# Altium footprint library microbuilder.PCBLIB: 422 footprints (part 3 of 27)
Each footprint in its own frame and in the unit in brackets; x right, y up, seen from the top. Pads: shape width x height; smd on the part's side, far side on the other; paste and mask are expansions set on the pad; w line width, h text height; cw(c..) or ccw(c..) is an arc to the next point about the centre after c.
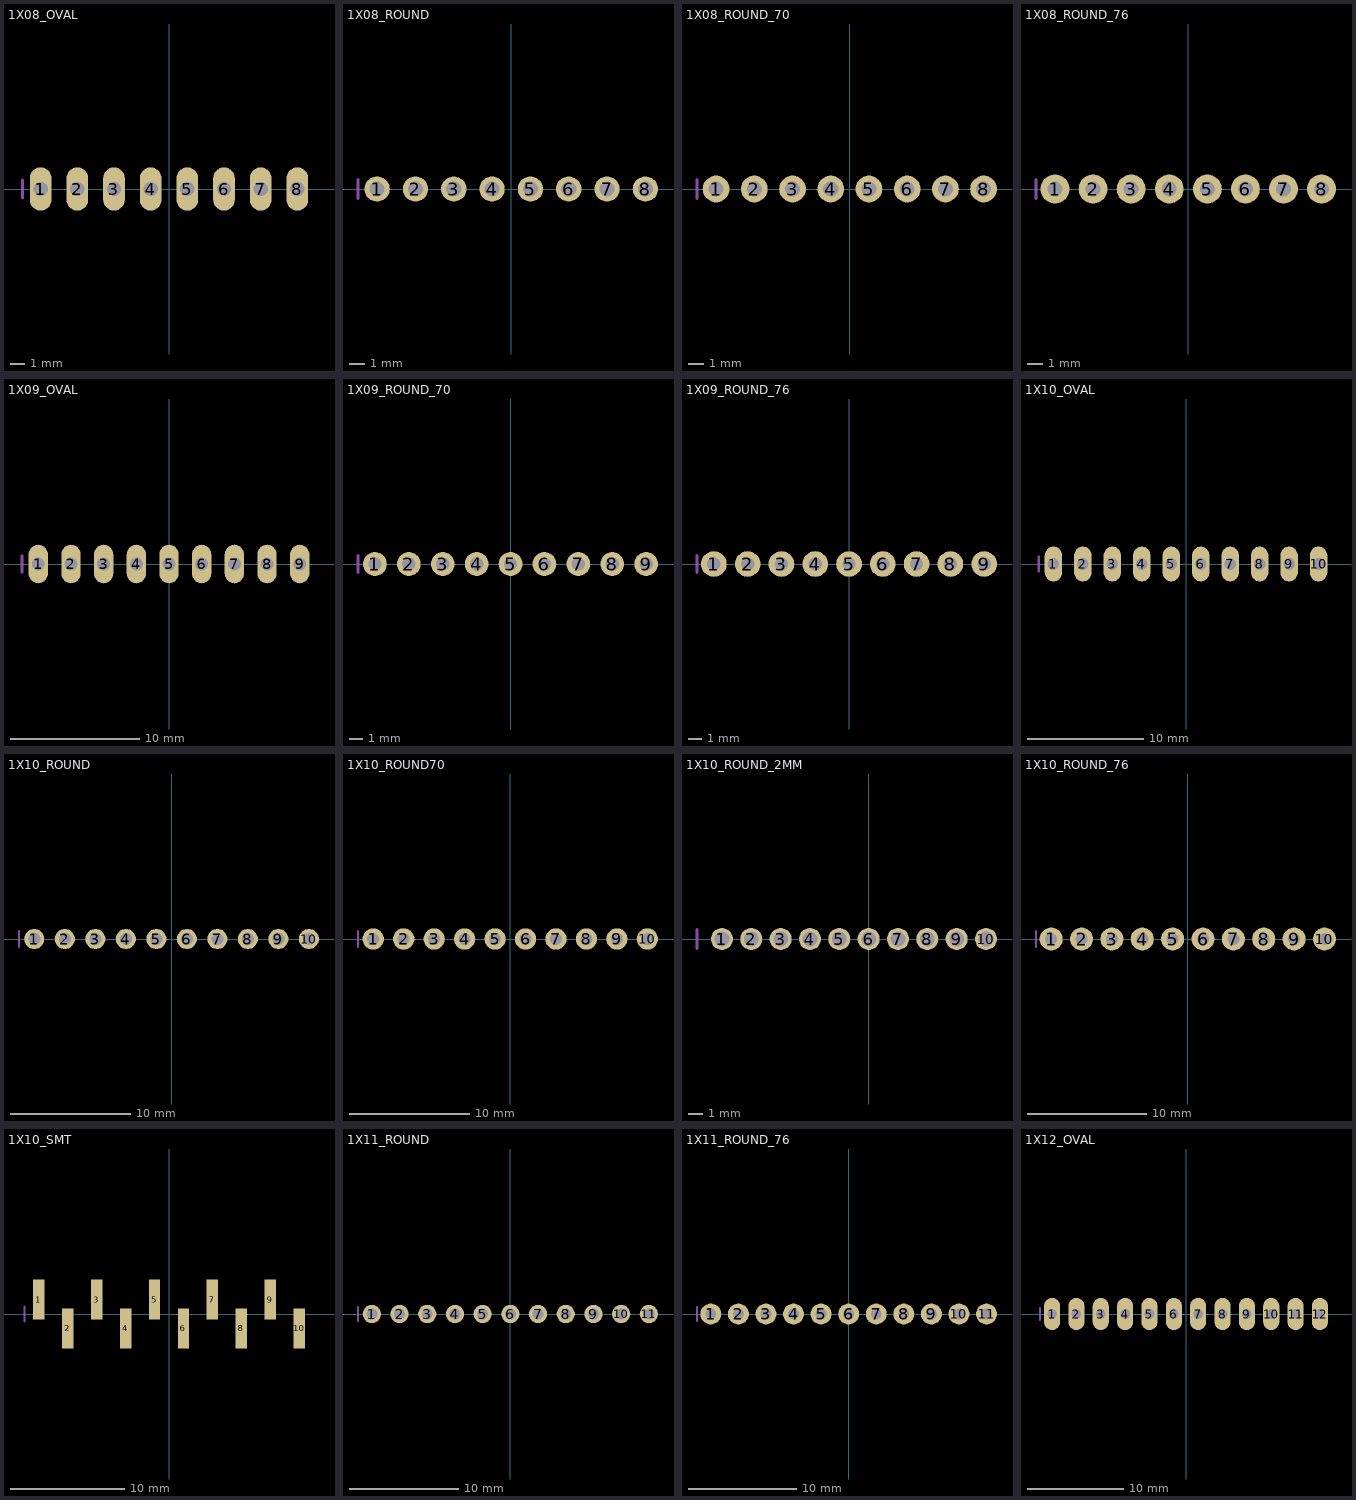
[diagram p2: the footprints below, top view; thin cyan lines are the x and y axes]

## 1X08_OVAL [mm]
pads (8):
  oval 1.5x3 hole 1: 1(-8.89,0) 2(-6.35,0) 3(-3.81,0) 4(-1.27,0) 5(1.27,0) 6(3.81,0) 7(6.35,0) 8(8.89,0)
Mechanical 16:
  rectangle: 6.096,-0.254 6.604,0.254
  rectangle: 3.556,-0.254 4.064,0.254
  rectangle: 1.016,-0.254 1.524,0.254
  rectangle: -1.524,-0.254 -1.016,0.254
  rectangle: -4.064,-0.254 -3.556,0.254
  rectangle: -6.604,-0.254 -6.096,0.254
  rectangle: -9.144,-0.254 -8.636,0.254
  rectangle: 8.636,-0.254 9.144,0.254
  lines w0.203: -10.16,-0.635 -10.16,0.635

## 1X08_ROUND [mil]
pads (8):
  round 66 hole 39.37: 1(-350,0) 2(-250,0) 3(-150,0) 4(-50,0) 5(50,0) 6(150,0) 7(250,0) 8(350,0)
Mechanical 16:
  rectangle: 240,-10 260,10
  rectangle: 140,-10 160,10
  rectangle: 40,-10 60,10
  rectangle: -60,-10 -40,10
  rectangle: -160,-10 -140,10
  rectangle: -260,-10 -240,10
  rectangle: -360,-10 -340,10
  rectangle: 340,-10 360,10
  lines w8: -400,-25 -400,25

## 1X08_ROUND_70 [mil]
pads (8):
  round 70 hole 39.37: 1(-350,0) 2(-250,0) 3(-150,0) 4(-50,0) 5(50,0) 6(150,0) 7(250,0) 8(350,0)
Mechanical 16:
  rectangle: 240,-10 260,10
  rectangle: 140,-10 160,10
  rectangle: 40,-10 60,10
  rectangle: -60,-10 -40,10
  rectangle: -160,-10 -140,10
  rectangle: -260,-10 -240,10
  rectangle: -360,-10 -340,10
  rectangle: 340,-10 360,10
  lines w8: -400,-25 -400,25

## 1X08_ROUND_76 [mil]
pads (8):
  round 76 hole 39.37: 1(-350,0) 2(-250,0) 3(-150,0) 4(-50,0) 5(50,0) 6(150,0) 7(250,0) 8(350,0)
Mechanical 16:
  rectangle: 240,-10 260,10
  rectangle: 140,-10 160,10
  rectangle: 40,-10 60,10
  rectangle: -60,-10 -40,10
  rectangle: -160,-10 -140,10
  rectangle: -260,-10 -240,10
  rectangle: -360,-10 -340,10
  rectangle: 340,-10 360,10
  lines w8: -400,-25 -400,25

## 1X09_OVAL [mm]
pads (9):
  oval 1.5x3 hole 1: 1(-10.16,0) 2(-7.62,0) 3(-5.08,0) 4(-2.54,0) 5(0,0) 6(2.54,0) 7(5.08,0) 8(7.62,0) 9(10.16,0)
Mechanical 16:
  rectangle: 7.366,-0.254 7.874,0.254
  rectangle: 4.826,-0.254 5.334,0.254
  rectangle: 2.286,-0.254 2.794,0.254
  rectangle: -0.254,-0.254 0.254,0.254
  rectangle: -2.794,-0.254 -2.286,0.254
  rectangle: -5.334,-0.254 -4.826,0.254
  rectangle: -7.874,-0.254 -7.366,0.254
  rectangle: -10.414,-0.254 -9.906,0.254
  rectangle: 9.906,-0.254 10.414,0.254
  lines w0.203: -11.43,-0.635 -11.43,0.635

## 1X09_ROUND_70 [mil]
pads (9):
  round 70 hole 39.37: 1(-400,0) 2(-300,0) 3(-200,0) 4(-100,0) 5(0,0) 6(100,0) 7(200,0) 8(300,0) 9(400,0)
Mechanical 16:
  rectangle: 290,-10 310,10
  rectangle: 190,-10 210,10
  rectangle: 90,-10 110,10
  rectangle: -10,-10 10,10
  rectangle: -110,-10 -90,10
  rectangle: -210,-10 -190,10
  rectangle: -310,-10 -290,10
  rectangle: -410,-10 -390,10
  rectangle: 390,-10 410,10
  lines w8: -450,-25 -450,25

## 1X09_ROUND_76 [mil]
pads (9):
  round 76 hole 39.37: 1(-400,0) 2(-300,0) 3(-200,0) 4(-100,0) 5(0,0) 6(100,0) 7(200,0) 8(300,0) 9(400,0)
Mechanical 16:
  rectangle: 290,-10 310,10
  rectangle: 190,-10 210,10
  rectangle: 90,-10 110,10
  rectangle: -10,-10 10,10
  rectangle: -110,-10 -90,10
  rectangle: -210,-10 -190,10
  rectangle: -310,-10 -290,10
  rectangle: -410,-10 -390,10
  rectangle: 390,-10 410,10
  lines w8: -450,-25 -450,25

## 1X10_OVAL [mm]
pads (10):
  oval 1.5x3 hole 1: 1(-11.43,0) 2(-8.89,0) 3(-6.35,0) 4(-3.81,0) 5(-1.27,0) 6(1.27,0) 7(3.81,0) 8(6.35,0) 9(8.89,0) 10(11.43,0)
Mechanical 16:
  rectangle: 8.636,-0.254 9.144,0.254
  rectangle: 6.096,-0.254 6.604,0.254
  rectangle: 3.556,-0.254 4.064,0.254
  rectangle: 1.016,-0.254 1.524,0.254
  rectangle: -1.524,-0.254 -1.016,0.254
  rectangle: -4.064,-0.254 -3.556,0.254
  rectangle: -6.604,-0.254 -6.096,0.254
  rectangle: -9.144,-0.254 -8.636,0.254
  rectangle: -11.684,-0.254 -11.176,0.254
  rectangle: 11.176,-0.254 11.684,0.254
  lines w0.203: -12.7,-0.635 -12.7,0.635

## 1X10_ROUND [mil]
pads (10):
  round 66 hole 39.37: 1(-450,0) 2(-350,0) 3(-250,0) 4(-150,0) 5(-50,0) 6(50,0) 7(150,0) 8(250,0) 9(350,0) 10(450,0)
Mechanical 16:
  rectangle: 340,-10 360,10
  rectangle: 240,-10 260,10
  rectangle: 140,-10 160,10
  rectangle: 40,-10 60,10
  rectangle: -60,-10 -40,10
  rectangle: -160,-10 -140,10
  rectangle: -260,-10 -240,10
  rectangle: -360,-10 -340,10
  rectangle: -460,-10 -440,10
  rectangle: 440,-10 460,10
  lines w8: -500,-25 -500,25

## 1X10_ROUND70 [mil]
pads (10):
  round 70 hole 39.37: 1(-450,0) 2(-350,0) 3(-250,0) 4(-150,0) 5(-50,0) 6(50,0) 7(150,0) 8(250,0) 9(350,0) 10(450,0)
Mechanical 16:
  rectangle: 340,-10 360,10
  rectangle: 240,-10 260,10
  rectangle: 140,-10 160,10
  rectangle: 40,-10 60,10
  rectangle: -60,-10 -40,10
  rectangle: -160,-10 -140,10
  rectangle: -260,-10 -240,10
  rectangle: -360,-10 -340,10
  rectangle: -460,-10 -440,10
  rectangle: 440,-10 460,10
  lines w8: -500,-25 -500,25

## 1X10_ROUND_2MM [mm]
pads (10):
  round 1.5 hole 1: 1(-10,0) 2(-8,0) 3(-6,0) 4(-4,0) 5(-2,0) 6(0,0) 7(2,0) 8(4,0) 9(6,0) 10(8,0)
Mechanical 16:
  rectangle: -10.234,-0.254 -9.726,0.254
  rectangle: -8.234,-0.254 -7.726,0.254
  rectangle: -6.234,-0.254 -5.726,0.254
  rectangle: -4.234,-0.254 -3.726,0.254
  rectangle: -2.234,-0.254 -1.726,0.254
  rectangle: -0.234,-0.254 0.274,0.254
  rectangle: 1.766,-0.254 2.274,0.254
  rectangle: 3.766,-0.254 4.274,0.254
  rectangle: 5.766,-0.254 6.274,0.254
  rectangle: 7.766,-0.254 8.274,0.254
  lines w0.203: -11.7,-0.635 -11.7,0.635

## 1X10_ROUND_76 [mil]
pads (10):
  round 76 hole 39.37: 1(-450,0) 2(-350,0) 3(-250,0) 4(-150,0) 5(-50,0) 6(50,0) 7(150,0) 8(250,0) 9(350,0) 10(450,0)
Mechanical 16:
  rectangle: 340,-10 360,10
  rectangle: 240,-10 260,10
  rectangle: 140,-10 160,10
  rectangle: 40,-10 60,10
  rectangle: -60,-10 -40,10
  rectangle: -160,-10 -140,10
  rectangle: -260,-10 -240,10
  rectangle: -360,-10 -340,10
  rectangle: -460,-10 -440,10
  rectangle: 440,-10 460,10
  lines w8: -500,-25 -500,25

## 1X10_SMT [mm]
pads (10):
  rect 1x3.5 smd: 1(-11.43,1.27) 2(-8.89,-1.27) 3(-6.35,1.27) 4(-3.81,-1.27) 5(-1.27,1.27) 6(1.27,-1.27) 7(3.81,1.27) 8(6.35,-1.27) 9(8.89,1.27) 10(11.43,-1.27)
Mechanical 16:
  lines w0.203: -12.7,-0.635 -12.7,0.635

## 1X11_ROUND [mil]
pads (11):
  round 66 hole 39.37: 1(-500,0) 2(-400,0) 3(-300,0) 4(-200,0) 5(-100,0) 6(0,0) 7(100,0) 8(200,0) 9(300,0) 10(400,0) 11(500,0)
Mechanical 16:
  rectangle: 290,-10 310,10
  rectangle: 190,-10 210,10
  rectangle: 90,-10 110,10
  rectangle: -10,-10 10,10
  rectangle: -110,-10 -90,10
  rectangle: -210,-10 -190,10
  rectangle: -310,-10 -290,10
  rectangle: -410,-10 -390,10
  rectangle: -510,-10 -490,10
  rectangle: 390,-10 410,10
  rectangle: 490,-10 510,10
  lines w8: -550,-25 -550,25

## 1X11_ROUND_76 [mil]
pads (11):
  round 76 hole 39.37: 1(-500,0) 2(-400,0) 3(-300,0) 4(-200,0) 5(-100,0) 6(0,0) 7(100,0) 8(200,0) 9(300,0) 10(400,0) 11(500,0)
Mechanical 16:
  rectangle: 290,-10 310,10
  rectangle: 190,-10 210,10
  rectangle: 90,-10 110,10
  rectangle: -10,-10 10,10
  rectangle: -110,-10 -90,10
  rectangle: -210,-10 -190,10
  rectangle: -310,-10 -290,10
  rectangle: -410,-10 -390,10
  rectangle: -510,-10 -490,10
  rectangle: 390,-10 410,10
  rectangle: 490,-10 510,10
  lines w8: -550,-25 -550,25

## 1X12_OVAL [mil]
pads (12):
  oval 66x132 hole 39.37: 1(-550,0) 2(-450,0) 3(-350,0) 4(-250,0) 5(-150,0) 6(-50,0) 7(50,0) 8(150,0) 9(250,0) 10(350,0) 11(450,0) 12(550,0)
Mechanical 16:
  rectangle: 240,-10 260,10
  rectangle: 140,-10 160,10
  rectangle: 40,-10 60,10
  rectangle: -60,-10 -40,10
  rectangle: -160,-10 -140,10
  rectangle: -260,-10 -240,10
  rectangle: -360,-10 -340,10
  rectangle: -460,-10 -440,10
  rectangle: -560,-10 -540,10
  rectangle: 340,-10 360,10
  rectangle: 440,-10 460,10
  rectangle: 540,-10 560,10
  lines w8: -600,-25 -600,25